# Altium footprint library DaughterBoard.PcbLib: 103 footprints (part 3 of 7)
Each footprint in its own frame and in the unit in brackets; x right, y up, seen from the top. Pads: shape width x height; smd on the part's side, far side on the other; paste and mask are expansions set on the pad; w line width, h text height; cw(c..) or ccw(c..) is an arc to the next point about the centre after c.
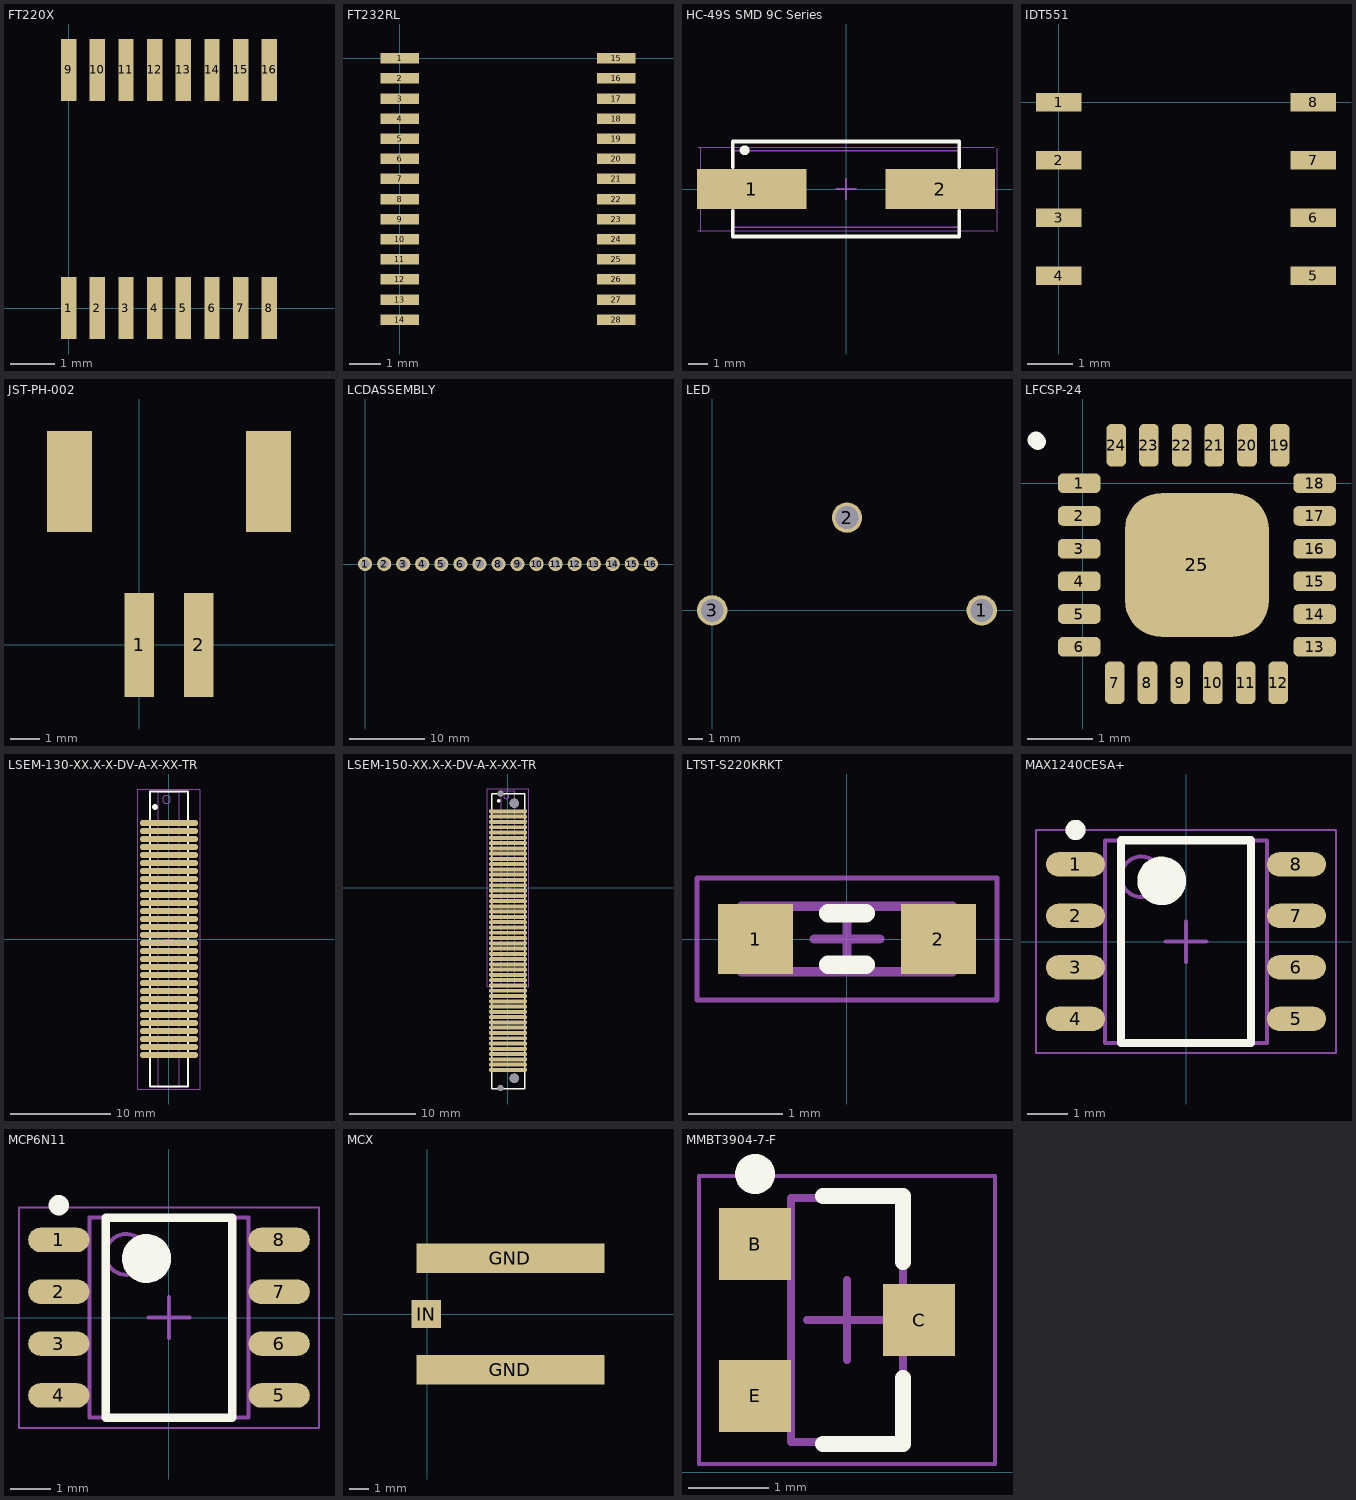
[diagram p2: the footprints below, top view; thin cyan lines are the x and y axes]

## FT220X [mm]
pads (16):
  rect 0.35x1.4 smd: 1(0,0) 2(0.65,0) 3(1.3,0) 4(1.95,0) 5(2.6,0) 6(3.25,0) 7(3.9,0) 8(4.55,0) 9(0,5.4) 10(0.65,5.4) 11(1.3,5.4) 12(1.95,5.4) 13(2.6,5.4) 14(3.25,5.4) 15(3.9,5.4) 16(4.55,5.4)
3D body "User Library-TSSOP-16-1.STEP": height 1.1, standoff 0, extent -0.214,-0.533 4.786,5.867

## FT232RL [mm]
pads (28):
  rect 1.25x0.34 smd: 1(0,0) 2(0,-0.65) 3(0,-1.3) 4(0,-1.95) 5(0,-2.6) 6(0,-3.25) 7(0,-3.9) 8(0,-4.55) 9(0,-5.2) 10(0,-5.85) 11(0,-6.5) 12(0,-7.15) 13(0,-7.8) 14(0,-8.45) 15(7,0) 16(7,-0.65) 17(7,-1.3) 18(7,-1.95) 19(7,-2.6) 20(7,-3.25) 21(7,-3.9) 22(7,-4.55) 23(7,-5.2) 24(7,-5.85) 25(7,-6.5) 26(7,-7.15) 27(7,-7.8) 28(7,-8.45)
3D body "User Library-ssop28_model.STEP": height 2.01, standoff 0.01, extent -0.471,-9.311 7.329,0.889

## HC-49S SMD 9C Series [mm]
height 4.1
pads (2):
  rect 5.5x2 smd: 1(-4.75,0) 2(4.75,0)
Top Overlay:
  circle w0.25: c-5.1,1.95 r0.125
  lines w0.2: -5.7,-1.1 -5.7,-2.4 5.7,-2.4 5.7,-1.1 ; -5.7,1.1 -5.7,2.4 5.7,2.4 5.7,1.1
Mechanical 13:
  lines w0.1: -5.675,-1.925 -5.675,1.925 5.675,1.925 5.675,-1.925 -5.675,-1.925
Mechanical 15:
  lines w0.05: -7.45,-2.1 7.45,-2.1 ; -7.45,2.1 7.45,2.1 ; -7.3,-2.15 -7.3,2.05 ; 7.6,-2.15 7.6,2.05
  lines w0.1: -0.5,0 0.5,0 ; 0,-0.5 0,0.5
3D body "HC-49S SMD 9C Series.step": height 4.1, standoff 0, extent -6.2,-1.925 6.5,1.925

## IDT551 [mil]
pads (8):
  rect 39.37x16 smd: 1(0,0) 2(0,-50) 3(0,-100) 4(0,-150) 5(220,-150) 6(220,-100) 7(220,-50) 8(220,0)
3D body "User Library-SOIC-8-1.STEP": height 68.9, standoff 0, extent -8.1,-171.46 228.12,21.46

## JST-PH-002 [mm]
pads (4):
  rect 1x3.5 smd: 1(0,0) 2(2,0)
  rect 1.5x3.4 smd: ""(-2.35,5.5) ""(4.35,5.5)
3D body "JST - PH - SMD (R) - 2Pin - 2.00mm.stp": height 5.38, standoff 0, extent -3.048,-1.054 5.099,7.201

## LCDASSEMBLY [mm]
pads (16):
  round 1.9 hole 1.2: 1(0,0) 2(2.54,0) 3(5.08,0) 4(7.62,0) 5(10.16,0) 6(12.7,0) 7(15.24,0) 8(17.78,0) 9(20.32,0) 10(22.86,0) 11(25.4,0) 12(27.94,0) 13(30.48,0) 14(33.02,0) 15(35.56,0) 16(38.1,0)
3D body "Pin Header 1x16 TH Angle Pitch 2.54mm.stp": height 4.13, standoff -6.99, extent -1.27,-1.397 39.375,4.893
3D body "User Library-LCD1602.step": height 37.76, standoff 1.76, extent -8.001,0.65 71.999,12.7

## LED [mil]
pads (3):
  round 80 hole 60: 1(710,0) 2(355,244.28) 3(0,0)

## LFCSP-24 [mm]
pads (25):
  rrect50% 0.65x0.3 smd: 1(-0.051,0) 2(-0.051,-0.5) 3(-0.051,-1) 4(-0.051,-1.5) 5(-0.051,-2) 6(-0.051,-2.5) 13(3.551,-2.5) 14(3.551,-2) 15(3.551,-1.5) 16(3.551,-1) 17(3.551,-0.5) 18(3.551,0)
  rrect50% 0.3x0.65 smd: 7(0.493,-3.051) 8(0.993,-3.051) 9(1.493,-3.051) 10(1.993,-3.051) 11(2.493,-3.051) 12(2.993,-3.051) 19(3.016,0.581) 20(2.516,0.581) 21(2.016,0.581) 22(1.516,0.581) 23(1.016,0.581) 24(0.516,0.581)
  rrect50% 2.2x2.2 smd: 25(1.75,-1.25)
Top Overlay:
  lines w0.254: -0.711,0.66 -0.686,0.635
3D body "User Library-LFCSP-24.step": height 0.83, standoff -0.02, extent -0.247,-3.244 3.753,0.756

## LRS-75 [mm]
3D body "LRS-75 Mean Well.STEP": height 30, standoff 0, extent 0,0 97,99

## LSEM-130-XX.X-X-DV-A-X-XX-TR [mm]
height 8
pads (30):
  oval 5.8x0.6 smd: 1(0,11.6) 2(0,10.8) 3(0,10) 4(0,9.2) 5(0,8.4) 6(0,7.6) 7(0,6.8) 8(0,6) 9(0,5.2) 10(0,4.4) 11(0,3.6) 12(0,2.8) 13(0,2) 14(0,1.2) 15(0,0.4) 16(0,-0.4) 17(0,-1.2) 18(0,-2) 19(0,-2.8) 20(0,-3.6) 21(0,-4.4) 22(0,-5.2) 23(0,-6) 24(0,-6.8) 25(0,-7.6) 26(0,-8.4) 27(0,-9.2) 28(0,-10) 29(0,-10.8) 30(0,-11.6)
Top Overlay:
  circle w0.25: c-1.4,13.2 r0.152
  lines w0.2: -1.9,-14.75 -1.9,14.75 1.9,14.75 1.9,-14.75 -1.9,-14.75
Mechanical 13:
  circle w0.1: c-0.25,13.95 r0.4
  lines w0.1: -1.05,-14.75 -1.05,14.75 1.05,14.75 1.05,-14.75 -1.05,-14.75
Mechanical 15:
  lines w0.05: -3.15,-15 -3.15,15 3.15,15 3.15,-15 -3.15,-15
  lines w0.1: -0.5,0 0.5,0 ; 0,-0.5 0,0.5
3D body "LSEM-130-04.0-L-DV-A-N-TR.stp": height 5.5, standoff -0.8, extent -2.665,-14.2 2.465,14.3

## LSEM-150-XX.X-X-DV-A-X-XX-TR [mm]
height 8
pads (50):
  oval 5.8x0.6 smd: 1(0,11.6) 2(0,10.8) 3(0,10) 4(0,9.2) 5(0,8.4) 6(0,7.6) 7(0,6.8) 8(0,6) 9(0,5.2) 10(0,4.4) 11(0,3.6) 12(0,2.8) 13(0,2) 14(0,1.2) 15(0,0.4) 16(0,-0.4) 17(0,-1.2) 18(0,-2) 19(0,-2.8) 20(0,-3.6) 21(0,-4.4) 22(0,-5.2) 23(0,-6) 24(0,-6.8) 25(0,-7.6) 26(0,-8.4) 27(0,-9.2) 28(0,-10) 29(0,-10.8) 30(0,-11.6) 31(0,-12.4) 32(0,-13.2) 33(0,-14) 34(0,-14.8) 35(0,-15.6) 36(0,-16.4) 37(0,-17.2) 38(0,-18) 39(0,-18.8) 40(0,-19.6) 41(0,-20.4) 42(0,-21.2) 43(0,-22) 44(0,-22.8) 45(0,-23.6) 46(0,-24.4) 47(0,-25.2) 48(0,-26) 49(0,-26.8) 50(0,-27.6)
via -1.15,-30.325 diameter 0.9 hole 0.9
via -1.15,14.325 diameter 0.9 hole 0.9
via 0.95,-28.85 diameter 1.42 hole 1.42
via 0.95,12.85 diameter 1.42 hole 1.42
Top Overlay:
  circle w0.25: c-1.4,13.2 r0.152
  lines w0.2: -2.489,-30.429 -2.489,14.3 2.515,14.3 2.515,-30.429 -2.489,-30.429
Mechanical 13:
  circle w0.1: c-0.25,13.95 r0.4
  lines w0.1: -1.05,-14.75 -1.05,14.75 1.05,14.75 1.05,-14.75 -1.05,-14.75
Mechanical 15:
  lines w0.05: -3.15,-15 -3.15,15 3.15,15 3.15,-15 -3.15,-15
  lines w0.1: -0.5,0 0.5,0 ; 0,-0.5 0,0.5
3D body "LSEM-150-04.0-L-DV-A-N-TR.stp": height 5.6, standoff -0.7, extent -2.591,-30.301 2.539,14.199

## LTST-S220KRKT [mm]
height 1.1
pads (2):
  rect 0.8x0.75 smd: 1(-0.975,0) 2(0.975,0)
Top Overlay:
  lines w0.2: -0.2,-0.275 0.2,-0.275 ; -0.2,0.275 0.2,0.275
Mechanical 13:
  lines w0.1: -1.125,-0.35 1.125,-0.35 1.125,0.35 -1.125,0.35 -1.125,-0.35
Mechanical 15:
  lines w0.05: -1.6,-0.65 1.6,-0.65 1.6,0.65 -1.6,0.65 -1.6,-0.65
  lines w0.1: -0.35,0 0.35,0 ; 0,-0.35 0,0.35
3D body "LTST-S220KRKT.step": height 1.1, standoff 0, extent -1.125,-0.35 1.125,0.35

## MAX1240CESA+ [mm]
height 1.75
pads (8):
  oval 1.45x0.6 smd: 1(-2.725,1.905) 2(-2.725,0.635) 3(-2.725,-0.635) 4(-2.725,-1.905) 5(2.725,-1.905) 6(2.725,-0.635) 7(2.725,0.635) 8(2.725,1.905)
Top Overlay:
  circle w0.6: c-0.6,1.5 r0.3
  circle w0.25: c-2.725,2.755 r0.125
  lines w0.2: -1.6,-2.5 1.6,-2.5 1.6,2.5 -1.6,2.5 -1.6,-2.5
Mechanical 13:
  circle w0.1: c-1.1,1.6 r0.5
  lines w0.1: -2,-2.5 2,-2.5 2,2.5 -2,2.5 -2,-2.5
Mechanical 15:
  lines w0.05: -3.7,-2.75 3.7,-2.75 3.7,2.75 -3.7,2.75 -3.7,-2.75
  lines w0.1: -0.5,0 0.5,0 ; 0,-0.5 0,0.5
3D body "MAX1240CESA+.step": height 1.75, standoff 0, extent -3,-2.5 3,2.5

## MCP6N11 [mm] "SOIC, 8-Leads, Body 4.90x3.90mm, Pitch 1.27mm, IPC Medium Density"
height 1.75
pads (8):
  oval 1.5x0.6 smd: 1(-2.7,1.905) 2(-2.7,0.635) 3(-2.7,-0.635) 4(-2.7,-1.905) 5(2.7,-1.905) 6(2.7,-0.635) 7(2.7,0.635) 8(2.7,1.905)
Top Overlay:
  circle w0.25: c-2.7,2.755 r0.125
  circle w0.6: c-0.55,1.45 r0.3
  lines w0.2: -1.55,-2.45 -1.55,2.45 1.55,2.45 1.55,-2.45 -1.55,-2.45
Mechanical 13:
  circle w0.1: c-1.05,1.55 r0.5
  lines w0.1: -1.95,-2.45 -1.95,2.45 1.95,2.45 1.95,-2.45 -1.95,-2.45
Mechanical 15:
  lines w0.05: -3.675,-2.7 -3.675,2.7 3.675,2.7 3.675,-2.7 -3.675,-2.7
  lines w0.1: -0.5,0 0.5,0 ; 0,-0.5 0,0.5
3D body "MCP6N11.step": height 1.75, standoff 0, extent -3,-2.45 3,2.45

## MCX [mm] "CONN MCX RCPT STR 50OHM EDGE MNT"
pads (3):
  rect 9.6x1.5 smd: GND(4.25,-2.85) GND(4.25,2.85)
  rect 1.5x1.45 smd: IN(-0.05,0)
3D body "734151061.stp": height 3, standoff -2, extent -0.55,-3.346 8.746,3.346

## MMBT3904-7-F [mm] "SOT23-3"
height 1.1
pads (3):
  rect 0.9x0.9 smd: B(-3.45,2.85) C(-1.4,1.9) E(-3.45,0.95)
Top Overlay:
  circle w0.25: c-3.45,3.725 r0.125
  lines w0.2: -2.6,0.35 -1.6,0.35 -1.6,1.175 ; -2.6,3.45 -1.6,3.45 -1.6,2.625
Mechanical 13:
  lines w0.1: -3,0.375 -1.6,0.375 -1.6,3.425 -3,3.425 -3,0.375
Mechanical 15:
  lines w0.05: -4.15,0.1 -0.45,0.1 -0.45,3.7 -4.15,3.7 -4.15,0.1
  lines w0.1: -2.8,1.9 -1.8,1.9 ; -2.3,1.4 -2.3,2.4
3D body "MMBT3904-7-F.step": height 1.1, standoff 0, extent -3.65,0.375 -1.15,3.425